# Altium schematic symbol library jlcpcb_2025_04_resistors_extended_2512.schlib: 2667 symbols (part 7 of 14)
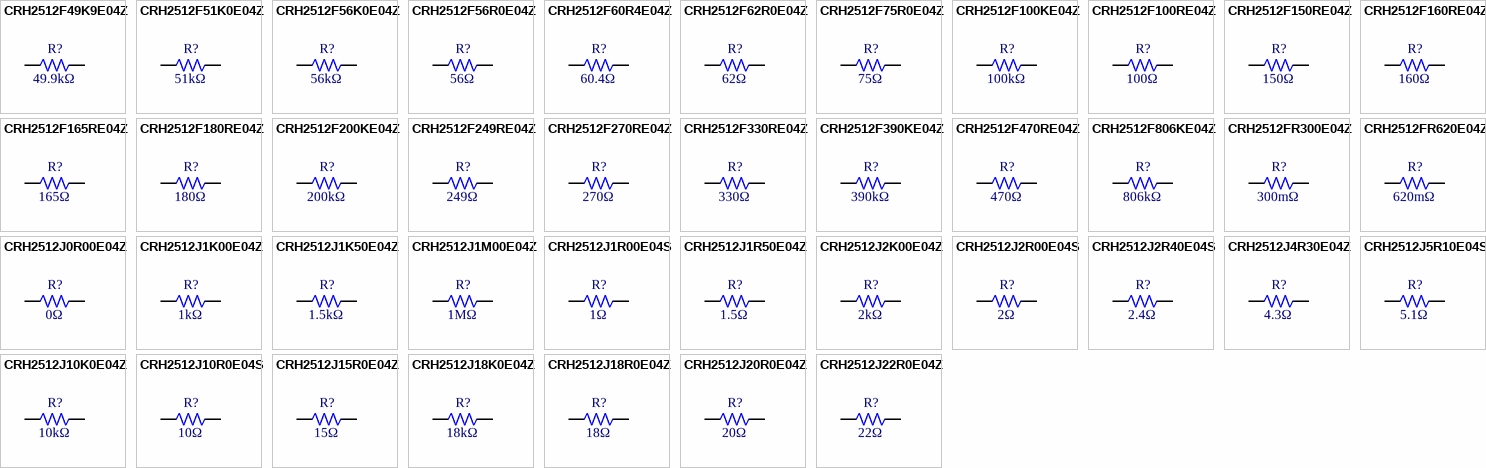
[diagram p72: symbols CRH2512F49K9E04Z to CRH2512J22R0E04Z]

## CRH2512J1K00E04Z
designator R?  Resistance: 1kΩ  (hidden comment: *)
Resistor, 1kΩ, ±5%, 2W, 200V, ±100ppm/℃, -55℃~+155℃, SMD 2512; Manufacturer: Uniroyal; Manufacturer Part Number: CRH2512J1K00E04Z; Supplier 1: LCSC; Supplier Part Number 1: C175457; JLCPCB Part Number: C175457; Power Rating: 2W; Category: Resistors; Package Size: 2512; JLCPCB Basic Part: Yes; Tolerance: ±5%; Voltage Rating: 200V; Temperature Coefficient: ±100ppm/℃; Temperature Rating: -55℃~+155℃; ComponentLink1Description: Datasheet; ComponentLink1URL: https://wmsc.lcsc.com/wmsc/upload/file/pdf/v2/lcsc/2304140030_Ever-Ohms-Tech-CRH2512J1K00E04Z_C175457.pdf; ComponentLink2Description: JLCPCB Part URL; ComponentLink2URL: https://jlcpcb.com/partdetail/C175457
pins: 1, 2
1 alternate drawing of the same symbol

## CRH2512J1K50E04Z
designator R?  Resistance: 1.5kΩ  (hidden comment: *)
Resistor, 1.5kΩ, ±5%, 2W, 200V, ±100ppm/℃, -55℃~+155℃, SMD 2512; Manufacturer: Uniroyal; Manufacturer Part Number: CRH2512J1K50E04Z; Supplier 1: LCSC; Supplier Part Number 1: C175461; JLCPCB Part Number: C175461; Power Rating: 2W; Category: Resistors; Package Size: 2512; JLCPCB Basic Part: Yes; Tolerance: ±5%; Voltage Rating: 200V; Temperature Coefficient: ±100ppm/℃; Temperature Rating: -55℃~+155℃; ComponentLink1Description: Datasheet; ComponentLink1URL: https://wmsc.lcsc.com/wmsc/upload/file/pdf/v2/lcsc/2304140030_Ever-Ohms-Tech-CRH2512J1K50E04Z_C175461.pdf; ComponentLink2Description: JLCPCB Part URL; ComponentLink2URL: https://jlcpcb.com/partdetail/C175461
pins: 1, 2
1 alternate drawing of the same symbol

## CRH2512J1M00E04Z
designator R?  Resistance: 1MΩ  (hidden comment: *)
Resistor, 1MΩ, ±5%, 2W, 200V, ±100ppm/℃, -55℃~+155℃, SMD 2512; Manufacturer: Uniroyal; Manufacturer Part Number: CRH2512J1M00E04Z; Supplier 1: LCSC; Supplier Part Number 1: C175493; JLCPCB Part Number: C175493; Power Rating: 2W; Category: Resistors; Package Size: 2512; JLCPCB Basic Part: Yes; Tolerance: ±5%; Voltage Rating: 200V; Temperature Coefficient: ±100ppm/℃; Temperature Rating: -55℃~+155℃; ComponentLink1Description: Datasheet; ComponentLink1URL: https://wmsc.lcsc.com/wmsc/upload/file/pdf/v2/lcsc/2304140030_Ever-Ohms-Tech-CRH2512J1M00E04Z_C175493.pdf; ComponentLink2Description: JLCPCB Part URL; ComponentLink2URL: https://jlcpcb.com/partdetail/C175493
pins: 1, 2
1 alternate drawing of the same symbol

## CRH2512J1R00E04S
designator R?  Resistance: 1Ω  (hidden comment: *)
Resistor, 1Ω, ±5%, 2W, 200V, ±400ppm/℃, -55℃~+155℃, SMD 2512; Manufacturer: Uniroyal; Manufacturer Part Number: CRH2512J1R00E04S; Supplier 1: LCSC; Supplier Part Number 1: C3002284; JLCPCB Part Number: C3002284; Power Rating: 2W; Category: Resistors; Package Size: 2512; JLCPCB Basic Part: Yes; Tolerance: ±5%; Voltage Rating: 200V; Temperature Coefficient: ±400ppm/℃; Temperature Rating: -55℃~+155℃; ComponentLink1Description: Datasheet; ComponentLink1URL: https://wmsc.lcsc.com/wmsc/upload/file/pdf/v2/lcsc/2204211700_Ever-Ohms-Tech-CRH2512J1R00E04S_C3002284.pdf; ComponentLink2Description: JLCPCB Part URL; ComponentLink2URL: https://jlcpcb.com/partdetail/C3002284
pins: 1, 2
1 alternate drawing of the same symbol

## CRH2512J1R50E04Z
designator R?  Resistance: 1.5Ω  (hidden comment: *)
Resistor, 1.5Ω, ±5%, 2W, 200V, ±400ppm/℃, -55℃~+155℃, SMD 2512; Manufacturer: Uniroyal; Manufacturer Part Number: CRH2512J1R50E04Z; Supplier 1: LCSC; Supplier Part Number 1: C175408; JLCPCB Part Number: C175408; Power Rating: 2W; Category: Resistors; Package Size: 2512; JLCPCB Basic Part: Yes; Tolerance: ±5%; Voltage Rating: 200V; Temperature Coefficient: ±400ppm/℃; Temperature Rating: -55℃~+155℃; ComponentLink1Description: Datasheet; ComponentLink1URL: https://wmsc.lcsc.com/wmsc/upload/file/pdf/v2/lcsc/2304140030_Ever-Ohms-Tech-CRH2512J1R50E04Z_C175408.pdf; ComponentLink2Description: JLCPCB Part URL; ComponentLink2URL: https://jlcpcb.com/partdetail/C175408
pins: 1, 2
1 alternate drawing of the same symbol

## CRH2512J2K00E04Z
designator R?  Resistance: 2kΩ  (hidden comment: *)
Resistor, 2kΩ, ±5%, 2W, 200V, ±100ppm/℃, -55℃~+155℃, SMD 2512; Manufacturer: Uniroyal; Manufacturer Part Number: CRH2512J2K00E04Z; Supplier 1: LCSC; Supplier Part Number 1: C175463; JLCPCB Part Number: C175463; Power Rating: 2W; Category: Resistors; Package Size: 2512; JLCPCB Basic Part: Yes; Tolerance: ±5%; Voltage Rating: 200V; Temperature Coefficient: ±100ppm/℃; Temperature Rating: -55℃~+155℃; ComponentLink1Description: Datasheet; ComponentLink1URL: https://wmsc.lcsc.com/wmsc/upload/file/pdf/v2/lcsc/2304140030_Ever-Ohms-Tech-CRH2512J2K00E04Z_C175463.pdf; ComponentLink2Description: JLCPCB Part URL; ComponentLink2URL: https://jlcpcb.com/partdetail/C175463
pins: 1, 2
1 alternate drawing of the same symbol

## CRH2512J2R00E04S
designator R?  Resistance: 2Ω  (hidden comment: *)
Resistor, 2Ω, ±5%, 2W, 200V, ±400ppm/℃, -55℃~+155℃, SMD 2512; Manufacturer: Uniroyal; Manufacturer Part Number: CRH2512J2R00E04S; Supplier 1: LCSC; Supplier Part Number 1: C2832125; JLCPCB Part Number: C2832125; Power Rating: 2W; Category: Resistors; Package Size: 2512; JLCPCB Basic Part: Yes; Tolerance: ±5%; Voltage Rating: 200V; Temperature Coefficient: ±400ppm/℃; Temperature Rating: -55℃~+155℃; ComponentLink1Description: Datasheet; ComponentLink1URL: https://wmsc.lcsc.com/wmsc/upload/file/pdf/v2/lcsc/2108241730_Ever-Ohms-Tech-CRH2512J2R00E04S_C2832125.pdf; ComponentLink2Description: JLCPCB Part URL; ComponentLink2URL: https://jlcpcb.com/partdetail/C2832125
pins: 1, 2
1 alternate drawing of the same symbol

## CRH2512J2R40E04S
designator R?  Resistance: 2.4Ω  (hidden comment: *)
Resistor, 2.4Ω, ±5%, 2W, 200V, ±400ppm/℃, -55℃~+155℃, SMD 2512; Manufacturer: Uniroyal; Manufacturer Part Number: CRH2512J2R40E04S; Supplier 1: LCSC; Supplier Part Number 1: C2972090; JLCPCB Part Number: C2972090; Power Rating: 2W; Category: Resistors; Package Size: 2512; JLCPCB Basic Part: Yes; Tolerance: ±5%; Voltage Rating: 200V; Temperature Coefficient: ±400ppm/℃; Temperature Rating: -55℃~+155℃; ComponentLink1Description: Datasheet; ComponentLink1URL: https://wmsc.lcsc.com/wmsc/upload/file/pdf/v2/lcsc/2201261400_Ever-Ohms-Tech-CRH2512J2R40E04S_C2972090.pdf; ComponentLink2Description: JLCPCB Part URL; ComponentLink2URL: https://jlcpcb.com/partdetail/C2972090
pins: 1, 2
1 alternate drawing of the same symbol

## CRH2512J4R30E04Z
designator R?  Resistance: 4.3Ω  (hidden comment: *)
Resistor, 4.3Ω, ±5%, 2W, 200V, ±400ppm/℃, -55℃~+155℃, SMD 2512; Manufacturer: Uniroyal; Manufacturer Part Number: CRH2512J4R30E04Z; Supplier 1: LCSC; Supplier Part Number 1: C175417; JLCPCB Part Number: C175417; Power Rating: 2W; Category: Resistors; Package Size: 2512; JLCPCB Basic Part: Yes; Tolerance: ±5%; Voltage Rating: 200V; Temperature Coefficient: ±400ppm/℃; Temperature Rating: -55℃~+155℃; ComponentLink1Description: Datasheet; ComponentLink1URL: https://wmsc.lcsc.com/wmsc/upload/file/pdf/v2/lcsc/2304140030_Ever-Ohms-Tech-CRH2512J4R30E04Z_C175417.pdf; ComponentLink2Description: JLCPCB Part URL; ComponentLink2URL: https://jlcpcb.com/partdetail/C175417
pins: 1, 2
1 alternate drawing of the same symbol

## CRH2512J5R10E04S
designator R?  Resistance: 5.1Ω  (hidden comment: *)
Resistor, 5.1Ω, ±5%, 2W, 200V, ±400ppm/℃, -55℃~+155℃, SMD 2512; Manufacturer: Uniroyal; Manufacturer Part Number: CRH2512J5R10E04S; Supplier 1: LCSC; Supplier Part Number 1: C3002283; JLCPCB Part Number: C3002283; Power Rating: 2W; Category: Resistors; Package Size: 2512; JLCPCB Basic Part: Yes; Tolerance: ±5%; Voltage Rating: 200V; Temperature Coefficient: ±400ppm/℃; Temperature Rating: -55℃~+155℃; ComponentLink1Description: Datasheet; ComponentLink1URL: https://wmsc.lcsc.com/wmsc/upload/file/pdf/v2/lcsc/2204211700_Ever-Ohms-Tech-CRH2512J5R10E04S_C3002283.pdf; ComponentLink2Description: JLCPCB Part URL; ComponentLink2URL: https://jlcpcb.com/partdetail/C3002283
pins: 1, 2
1 alternate drawing of the same symbol

## CRH2512J10K0E04Z
designator R?  Resistance: 10kΩ  (hidden comment: *)
Resistor, 10kΩ, ±5%, 2W, 200V, ±100ppm/℃, -55℃~+155℃, SMD 2512; Manufacturer: Uniroyal; Manufacturer Part Number: CRH2512J10K0E04Z; Supplier 1: LCSC; Supplier Part Number 1: C149859; JLCPCB Part Number: C149859; Power Rating: 2W; Category: Resistors; Package Size: 2512; JLCPCB Basic Part: Yes; Tolerance: ±5%; Voltage Rating: 200V; Temperature Coefficient: ±100ppm/℃; Temperature Rating: -55℃~+155℃; ComponentLink1Description: Datasheet; ComponentLink1URL: https://wmsc.lcsc.com/wmsc/upload/file/pdf/v2/lcsc/2304140030_Ever-Ohms-Tech-CRH2512J10K0E04Z_C149859.pdf; ComponentLink2Description: JLCPCB Part URL; ComponentLink2URL: https://jlcpcb.com/partdetail/C149859
pins: 1, 2
1 alternate drawing of the same symbol

## CRH2512J10R0E04S
designator R?  Resistance: 10Ω  (hidden comment: *)
Resistor, 10Ω, ±5%, 2W, 200V, ±100ppm/℃, -55℃~+155℃, SMD 2512; Manufacturer: Uniroyal; Manufacturer Part Number: CRH2512J10R0E04S; Supplier 1: LCSC; Supplier Part Number 1: C2909009; JLCPCB Part Number: C2909009; Power Rating: 2W; Category: Resistors; Package Size: 2512; JLCPCB Basic Part: Yes; Tolerance: ±5%; Voltage Rating: 200V; Temperature Coefficient: ±100ppm/℃; Temperature Rating: -55℃~+155℃; ComponentLink1Description: Datasheet; ComponentLink1URL: https://wmsc.lcsc.com/wmsc/upload/file/pdf/v2/lcsc/2110220930_Ever-Ohms-Tech-CRH2512J10R0E04S_C2909009.pdf; ComponentLink2Description: JLCPCB Part URL; ComponentLink2URL: https://jlcpcb.com/partdetail/C2909009
pins: 1, 2
1 alternate drawing of the same symbol

## CRH2512J15R0E04Z
designator R?  Resistance: 15Ω  (hidden comment: *)
Resistor, 15Ω, ±5%, 2W, 200V, ±100ppm/℃, -55℃~+155℃, SMD 2512; Manufacturer: Uniroyal; Manufacturer Part Number: CRH2512J15R0E04Z; Supplier 1: LCSC; Supplier Part Number 1: C175424; JLCPCB Part Number: C175424; Power Rating: 2W; Category: Resistors; Package Size: 2512; JLCPCB Basic Part: Yes; Tolerance: ±5%; Voltage Rating: 200V; Temperature Coefficient: ±100ppm/℃; Temperature Rating: -55℃~+155℃; ComponentLink1Description: Datasheet; ComponentLink1URL: https://wmsc.lcsc.com/wmsc/upload/file/pdf/v2/lcsc/2304140030_Ever-Ohms-Tech-CRH2512J15R0E04Z_C175424.pdf; ComponentLink2Description: JLCPCB Part URL; ComponentLink2URL: https://jlcpcb.com/partdetail/C175424
pins: 1, 2
1 alternate drawing of the same symbol

## CRH2512J18K0E04Z
designator R?  Resistance: 18kΩ  (hidden comment: *)
Resistor, 18kΩ, ±5%, 2W, 200V, ±100ppm/℃, -55℃~+155℃, SMD 2512; Manufacturer: Uniroyal; Manufacturer Part Number: CRH2512J18K0E04Z; Supplier 1: LCSC; Supplier Part Number 1: C175472; JLCPCB Part Number: C175472; Power Rating: 2W; Category: Resistors; Package Size: 2512; JLCPCB Basic Part: Yes; Tolerance: ±5%; Voltage Rating: 200V; Temperature Coefficient: ±100ppm/℃; Temperature Rating: -55℃~+155℃; ComponentLink1Description: Datasheet; ComponentLink1URL: https://wmsc.lcsc.com/wmsc/upload/file/pdf/v2/lcsc/2304140030_Ever-Ohms-Tech-CRH2512J18K0E04Z_C175472.pdf; ComponentLink2Description: JLCPCB Part URL; ComponentLink2URL: https://jlcpcb.com/partdetail/C175472
pins: 1, 2
1 alternate drawing of the same symbol

## CRH2512J18R0E04Z
designator R?  Resistance: 18Ω  (hidden comment: *)
Resistor, 18Ω, ±5%, 2W, 200V, ±100ppm/℃, -55℃~+155℃, SMD 2512; Manufacturer: Uniroyal; Manufacturer Part Number: CRH2512J18R0E04Z; Supplier 1: LCSC; Supplier Part Number 1: C175426; JLCPCB Part Number: C175426; Power Rating: 2W; Category: Resistors; Package Size: 2512; JLCPCB Basic Part: Yes; Tolerance: ±5%; Voltage Rating: 200V; Temperature Coefficient: ±100ppm/℃; Temperature Rating: -55℃~+155℃; ComponentLink1Description: Datasheet; ComponentLink1URL: https://wmsc.lcsc.com/wmsc/upload/file/pdf/v2/lcsc/2304140030_Ever-Ohms-Tech-CRH2512J18R0E04Z_C175426.pdf; ComponentLink2Description: JLCPCB Part URL; ComponentLink2URL: https://jlcpcb.com/partdetail/C175426
pins: 1, 2
1 alternate drawing of the same symbol

## CRH2512J20R0E04Z
designator R?  Resistance: 20Ω  (hidden comment: *)
Resistor, 20Ω, ±5%, 2W, 200V, ±100ppm/℃, -55℃~+155℃, SMD 2512; Manufacturer: Uniroyal; Manufacturer Part Number: CRH2512J20R0E04Z; Supplier 1: LCSC; Supplier Part Number 1: C175427; JLCPCB Part Number: C175427; Power Rating: 2W; Category: Resistors; Package Size: 2512; JLCPCB Basic Part: Yes; Tolerance: ±5%; Voltage Rating: 200V; Temperature Coefficient: ±100ppm/℃; Temperature Rating: -55℃~+155℃; ComponentLink1Description: Datasheet; ComponentLink1URL: https://wmsc.lcsc.com/wmsc/upload/file/pdf/v2/lcsc/2304140030_Ever-Ohms-Tech-CRH2512J20R0E04Z_C175427.pdf; ComponentLink2Description: JLCPCB Part URL; ComponentLink2URL: https://jlcpcb.com/partdetail/C175427
pins: 1, 2
1 alternate drawing of the same symbol

## CRH2512J22R0E04Z
designator R?  Resistance: 22Ω  (hidden comment: *)
Resistor, 22Ω, ±5%, 2W, 200V, ±100ppm/℃, -55℃~+155℃, SMD 2512; Manufacturer: Uniroyal; Manufacturer Part Number: CRH2512J22R0E04Z; Supplier 1: LCSC; Supplier Part Number 1: C175428; JLCPCB Part Number: C175428; Power Rating: 2W; Category: Resistors; Package Size: 2512; JLCPCB Basic Part: Yes; Tolerance: ±5%; Voltage Rating: 200V; Temperature Coefficient: ±100ppm/℃; Temperature Rating: -55℃~+155℃; ComponentLink1Description: Datasheet; ComponentLink1URL: https://wmsc.lcsc.com/wmsc/upload/file/pdf/v2/lcsc/2304140030_Ever-Ohms-Tech-CRH2512J22R0E04Z_C175428.pdf; ComponentLink2Description: JLCPCB Part URL; ComponentLink2URL: https://jlcpcb.com/partdetail/C175428
pins: 1, 2
1 alternate drawing of the same symbol

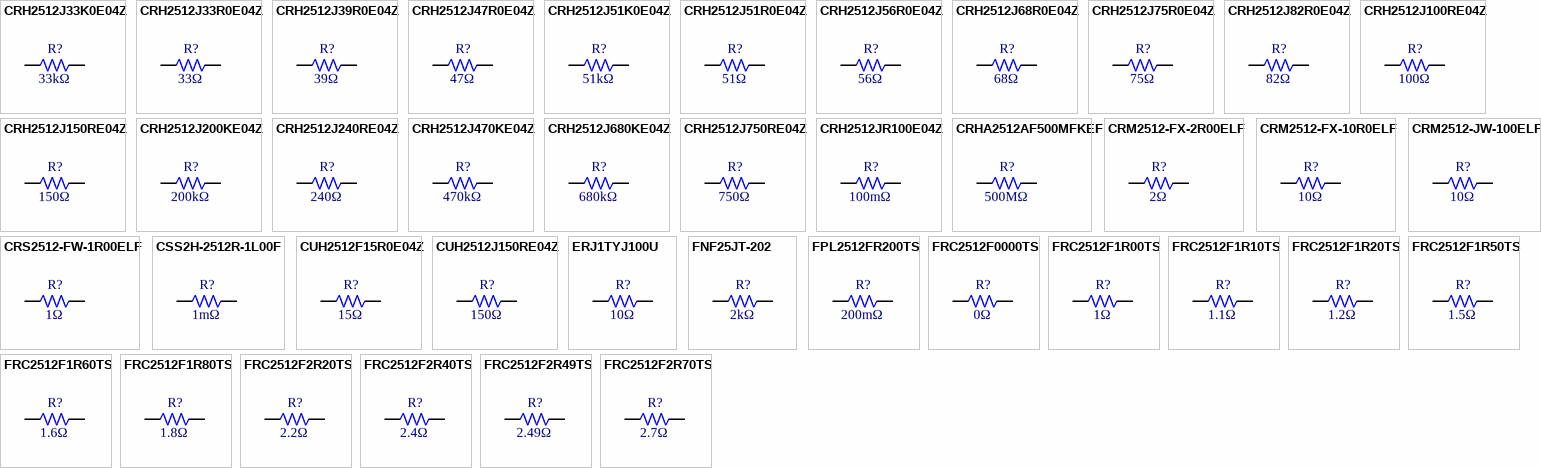
[diagram p30: symbols CRH2512J33K0E04Z to FRC2512F2R70TS]

## CRH2512J33K0E04Z
designator R?  Resistance: 33kΩ  (hidden comment: *)
Resistor, 33kΩ, ±5%, 2W, 200V, ±100ppm/℃, -55℃~+155℃, SMD 2512; Manufacturer: Uniroyal; Manufacturer Part Number: CRH2512J33K0E04Z; Supplier 1: LCSC; Supplier Part Number 1: C175474; JLCPCB Part Number: C175474; Power Rating: 2W; Category: Resistors; Package Size: 2512; JLCPCB Basic Part: Yes; Tolerance: ±5%; Voltage Rating: 200V; Temperature Coefficient: ±100ppm/℃; Temperature Rating: -55℃~+155℃; ComponentLink1Description: Datasheet; ComponentLink1URL: https://wmsc.lcsc.com/wmsc/upload/file/pdf/v2/lcsc/2304140030_Ever-Ohms-Tech-CRH2512J33K0E04Z_C175474.pdf; ComponentLink2Description: JLCPCB Part URL; ComponentLink2URL: https://jlcpcb.com/partdetail/C175474
pins: 1, 2
1 alternate drawing of the same symbol

## CRH2512J33R0E04Z
designator R?  Resistance: 33Ω  (hidden comment: *)
Resistor, 33Ω, ±5%, 2W, 200V, ±200ppm/℃, -55℃~+155℃, SMD 2512; Manufacturer: Uniroyal; Manufacturer Part Number: CRH2512J33R0E04Z; Supplier 1: LCSC; Supplier Part Number 1: C2835761; JLCPCB Part Number: C2835761; Power Rating: 2W; Category: Resistors; Package Size: 2512; JLCPCB Basic Part: Yes; Tolerance: ±5%; Voltage Rating: 200V; Temperature Coefficient: ±200ppm/℃; Temperature Rating: -55℃~+155℃; ComponentLink1Description: Datasheet; ComponentLink1URL: https://wmsc.lcsc.com/wmsc/upload/file/pdf/v2/lcsc/2105251933_Ever-Ohms-Tech-CRH2512J33R0E04Z_C2835761.pdf; ComponentLink2Description: JLCPCB Part URL; ComponentLink2URL: https://jlcpcb.com/partdetail/C2835761
pins: 1, 2
1 alternate drawing of the same symbol

## CRH2512J39R0E04Z
designator R?  Resistance: 39Ω  (hidden comment: *)
Resistor, 39Ω, ±5%, 2W, 200V, ±100ppm/℃, -55℃~+155℃, SMD 2512; Manufacturer: Uniroyal; Manufacturer Part Number: CRH2512J39R0E04Z; Supplier 1: LCSC; Supplier Part Number 1: C175429; JLCPCB Part Number: C175429; Power Rating: 2W; Category: Resistors; Package Size: 2512; JLCPCB Basic Part: Yes; Tolerance: ±5%; Voltage Rating: 200V; Temperature Coefficient: ±100ppm/℃; Temperature Rating: -55℃~+155℃; ComponentLink1Description: Datasheet; ComponentLink1URL: https://wmsc.lcsc.com/wmsc/upload/file/pdf/v2/lcsc/2304140030_Ever-Ohms-Tech-CRH2512J39R0E04Z_C175429.pdf; ComponentLink2Description: JLCPCB Part URL; ComponentLink2URL: https://jlcpcb.com/partdetail/C175429
pins: 1, 2
1 alternate drawing of the same symbol

## CRH2512J47R0E04Z
designator R?  Resistance: 47Ω  (hidden comment: *)
Resistor, 47Ω, ±5%, 2W, 200V, ±100ppm/℃, -55℃~+155℃, SMD 2512; Manufacturer: Uniroyal; Manufacturer Part Number: CRH2512J47R0E04Z; Supplier 1: LCSC; Supplier Part Number 1: C175430; JLCPCB Part Number: C175430; Power Rating: 2W; Category: Resistors; Package Size: 2512; JLCPCB Basic Part: Yes; Tolerance: ±5%; Voltage Rating: 200V; Temperature Coefficient: ±100ppm/℃; Temperature Rating: -55℃~+155℃; ComponentLink1Description: Datasheet; ComponentLink1URL: https://wmsc.lcsc.com/wmsc/upload/file/pdf/v2/lcsc/2304140030_Ever-Ohms-Tech-CRH2512J47R0E04Z_C175430.pdf; ComponentLink2Description: JLCPCB Part URL; ComponentLink2URL: https://jlcpcb.com/partdetail/C175430
pins: 1, 2
1 alternate drawing of the same symbol

## CRH2512J51K0E04Z
designator R?  Resistance: 51kΩ  (hidden comment: *)
Resistor, 51kΩ, ±5%, 2W, 200V, ±100ppm/℃, -55℃~+155℃, SMD 2512; Manufacturer: Uniroyal; Manufacturer Part Number: CRH2512J51K0E04Z; Supplier 1: LCSC; Supplier Part Number 1: C175479; JLCPCB Part Number: C175479; Power Rating: 2W; Category: Resistors; Package Size: 2512; JLCPCB Basic Part: Yes; Tolerance: ±5%; Voltage Rating: 200V; Temperature Coefficient: ±100ppm/℃; Temperature Rating: -55℃~+155℃; ComponentLink1Description: Datasheet; ComponentLink1URL: https://wmsc.lcsc.com/wmsc/upload/file/pdf/v2/lcsc/2304140030_Ever-Ohms-Tech-CRH2512J51K0E04Z_C175479.pdf; ComponentLink2Description: JLCPCB Part URL; ComponentLink2URL: https://jlcpcb.com/partdetail/C175479
pins: 1, 2
1 alternate drawing of the same symbol

## CRH2512J51R0E04Z
designator R?  Resistance: 51Ω  (hidden comment: *)
Resistor, 51Ω, ±5%, 2W, 200V, ±200ppm/℃, -55℃~+155℃, SMD 2512; Manufacturer: Uniroyal; Manufacturer Part Number: CRH2512J51R0E04Z; Supplier 1: LCSC; Supplier Part Number 1: C175432; JLCPCB Part Number: C175432; Power Rating: 2W; Category: Resistors; Package Size: 2512; JLCPCB Basic Part: Yes; Tolerance: ±5%; Voltage Rating: 200V; Temperature Coefficient: ±200ppm/℃; Temperature Rating: -55℃~+155℃; ComponentLink1Description: Datasheet; ComponentLink1URL: https://wmsc.lcsc.com/wmsc/upload/file/pdf/v2/lcsc/2304140030_Ever-Ohms-Tech-CRH2512J51R0E04Z_C175432.pdf; ComponentLink2Description: JLCPCB Part URL; ComponentLink2URL: https://jlcpcb.com/partdetail/C175432
pins: 1, 2
1 alternate drawing of the same symbol

## CRH2512J56R0E04Z
designator R?  Resistance: 56Ω  (hidden comment: *)
Resistor, 56Ω, ±5%, 2W, 200V, ±100ppm/℃, -55℃~+155℃, SMD 2512; Manufacturer: Uniroyal; Manufacturer Part Number: CRH2512J56R0E04Z; Supplier 1: LCSC; Supplier Part Number 1: C175433; JLCPCB Part Number: C175433; Power Rating: 2W; Category: Resistors; Package Size: 2512; JLCPCB Basic Part: Yes; Tolerance: ±5%; Voltage Rating: 200V; Temperature Coefficient: ±100ppm/℃; Temperature Rating: -55℃~+155℃; ComponentLink1Description: Datasheet; ComponentLink1URL: https://wmsc.lcsc.com/wmsc/upload/file/pdf/v2/lcsc/2304140030_Ever-Ohms-Tech-CRH2512J56R0E04Z_C175433.pdf; ComponentLink2Description: JLCPCB Part URL; ComponentLink2URL: https://jlcpcb.com/partdetail/C175433
pins: 1, 2
1 alternate drawing of the same symbol

## CRH2512J68R0E04Z
designator R?  Resistance: 68Ω  (hidden comment: *)
Resistor, 68Ω, ±5%, 2W, 200V, ±100ppm/℃, -55℃~+155℃, SMD 2512; Manufacturer: Uniroyal; Manufacturer Part Number: CRH2512J68R0E04Z; Supplier 1: LCSC; Supplier Part Number 1: C175435; JLCPCB Part Number: C175435; Power Rating: 2W; Category: Resistors; Package Size: 2512; JLCPCB Basic Part: Yes; Tolerance: ±5%; Voltage Rating: 200V; Temperature Coefficient: ±100ppm/℃; Temperature Rating: -55℃~+155℃; ComponentLink1Description: Datasheet; ComponentLink1URL: https://wmsc.lcsc.com/wmsc/upload/file/pdf/v2/lcsc/2304140030_Ever-Ohms-Tech-CRH2512J68R0E04Z_C175435.pdf; ComponentLink2Description: JLCPCB Part URL; ComponentLink2URL: https://jlcpcb.com/partdetail/C175435
pins: 1, 2
1 alternate drawing of the same symbol

## CRH2512J75R0E04Z
designator R?  Resistance: 75Ω  (hidden comment: *)
Resistor, 75Ω, ±5%, 2W, 200V, ±100ppm/℃, -55℃~+155℃, SMD 2512; Manufacturer: Uniroyal; Manufacturer Part Number: CRH2512J75R0E04Z; Supplier 1: LCSC; Supplier Part Number 1: C175437; JLCPCB Part Number: C175437; Power Rating: 2W; Category: Resistors; Package Size: 2512; JLCPCB Basic Part: Yes; Tolerance: ±5%; Voltage Rating: 200V; Temperature Coefficient: ±100ppm/℃; Temperature Rating: -55℃~+155℃; ComponentLink1Description: Datasheet; ComponentLink1URL: https://wmsc.lcsc.com/wmsc/upload/file/pdf/v2/lcsc/2304140030_Ever-Ohms-Tech-CRH2512J75R0E04Z_C175437.pdf; ComponentLink2Description: JLCPCB Part URL; ComponentLink2URL: https://jlcpcb.com/partdetail/C175437
pins: 1, 2
1 alternate drawing of the same symbol

## CRH2512J82R0E04Z
designator R?  Resistance: 82Ω  (hidden comment: *)
Resistor, 82Ω, ±5%, 2W, 200V, ±100ppm/℃, -55℃~+155℃, SMD 2512; Manufacturer: Uniroyal; Manufacturer Part Number: CRH2512J82R0E04Z; Supplier 1: LCSC; Supplier Part Number 1: C175438; JLCPCB Part Number: C175438; Power Rating: 2W; Category: Resistors; Package Size: 2512; JLCPCB Basic Part: Yes; Tolerance: ±5%; Voltage Rating: 200V; Temperature Coefficient: ±100ppm/℃; Temperature Rating: -55℃~+155℃; ComponentLink1Description: Datasheet; ComponentLink1URL: https://wmsc.lcsc.com/wmsc/upload/file/pdf/v2/lcsc/2304140030_Ever-Ohms-Tech-CRH2512J82R0E04Z_C175438.pdf; ComponentLink2Description: JLCPCB Part URL; ComponentLink2URL: https://jlcpcb.com/partdetail/C175438
pins: 1, 2
1 alternate drawing of the same symbol

## CRH2512J100RE04Z
designator R?  Resistance: 100Ω  (hidden comment: *)
Resistor, 100Ω, ±5%, 2W, 200V, ±100ppm/℃, -55℃~+155℃, SMD 2512; Manufacturer: Uniroyal; Manufacturer Part Number: CRH2512J100RE04Z; Supplier 1: LCSC; Supplier Part Number 1: C175441; JLCPCB Part Number: C175441; Power Rating: 2W; Category: Resistors; Package Size: 2512; JLCPCB Basic Part: Yes; Tolerance: ±5%; Voltage Rating: 200V; Temperature Coefficient: ±100ppm/℃; Temperature Rating: -55℃~+155℃; ComponentLink1Description: Datasheet; ComponentLink1URL: https://wmsc.lcsc.com/wmsc/upload/file/pdf/v2/lcsc/2304140030_Ever-Ohms-Tech-CRH2512J100RE04Z_C175441.pdf; ComponentLink2Description: JLCPCB Part URL; ComponentLink2URL: https://jlcpcb.com/partdetail/C175441
pins: 1, 2
1 alternate drawing of the same symbol

## CRH2512J150RE04Z
designator R?  Resistance: 150Ω  (hidden comment: *)
Resistor, 150Ω, ±5%, 2W, 200V, ±100ppm/℃, -55℃~+155℃, SMD 2512; Manufacturer: Uniroyal; Manufacturer Part Number: CRH2512J150RE04Z; Supplier 1: LCSC; Supplier Part Number 1: C175446; JLCPCB Part Number: C175446; Power Rating: 2W; Category: Resistors; Package Size: 2512; JLCPCB Basic Part: Yes; Tolerance: ±5%; Voltage Rating: 200V; Temperature Coefficient: ±100ppm/℃; Temperature Rating: -55℃~+155℃; ComponentLink1Description: Datasheet; ComponentLink1URL: https://wmsc.lcsc.com/wmsc/upload/file/pdf/v2/lcsc/2304140030_Ever-Ohms-Tech-CRH2512J150RE04Z_C175446.pdf; ComponentLink2Description: JLCPCB Part URL; ComponentLink2URL: https://jlcpcb.com/partdetail/C175446
pins: 1, 2
1 alternate drawing of the same symbol

## CRH2512J200KE04Z
designator R?  Resistance: 200kΩ  (hidden comment: *)
Resistor, 200kΩ, ±5%, 2W, 200V, ±100ppm/℃, -55℃~+155℃, SMD 2512; Manufacturer: Uniroyal; Manufacturer Part Number: CRH2512J200KE04Z; Supplier 1: LCSC; Supplier Part Number 1: C175486; JLCPCB Part Number: C175486; Power Rating: 2W; Category: Resistors; Package Size: 2512; JLCPCB Basic Part: Yes; Tolerance: ±5%; Voltage Rating: 200V; Temperature Coefficient: ±100ppm/℃; Temperature Rating: -55℃~+155℃; ComponentLink1Description: Datasheet; ComponentLink1URL: https://wmsc.lcsc.com/wmsc/upload/file/pdf/v2/lcsc/2304140030_Ever-Ohms-Tech-CRH2512J200KE04Z_C175486.pdf; ComponentLink2Description: JLCPCB Part URL; ComponentLink2URL: https://jlcpcb.com/partdetail/C175486
pins: 1, 2
1 alternate drawing of the same symbol

## CRH2512J240RE04Z
designator R?  Resistance: 240Ω  (hidden comment: *)
Resistor, 240Ω, ±5%, 2W, 200V, ±100ppm/℃, -55℃~+155℃, SMD 2512; Manufacturer: Uniroyal; Manufacturer Part Number: CRH2512J240RE04Z; Supplier 1: LCSC; Supplier Part Number 1: C175449; JLCPCB Part Number: C175449; Power Rating: 2W; Category: Resistors; Package Size: 2512; JLCPCB Basic Part: Yes; Tolerance: ±5%; Voltage Rating: 200V; Temperature Coefficient: ±100ppm/℃; Temperature Rating: -55℃~+155℃; ComponentLink1Description: Datasheet; ComponentLink1URL: https://wmsc.lcsc.com/wmsc/upload/file/pdf/v2/lcsc/2304140030_Ever-Ohms-Tech-CRH2512J240RE04Z_C175449.pdf; ComponentLink2Description: JLCPCB Part URL; ComponentLink2URL: https://jlcpcb.com/partdetail/C175449
pins: 1, 2
1 alternate drawing of the same symbol

## CRH2512J470KE04Z
designator R?  Resistance: 470kΩ  (hidden comment: *)
Resistor, 470kΩ, ±5%, 2W, 200V, ±100ppm/℃, -55℃~+155℃, SMD 2512; Manufacturer: Uniroyal; Manufacturer Part Number: CRH2512J470KE04Z; Supplier 1: LCSC; Supplier Part Number 1: C175490; JLCPCB Part Number: C175490; Power Rating: 2W; Category: Resistors; Package Size: 2512; JLCPCB Basic Part: Yes; Tolerance: ±5%; Voltage Rating: 200V; Temperature Coefficient: ±100ppm/℃; Temperature Rating: -55℃~+155℃; ComponentLink1Description: Datasheet; ComponentLink1URL: https://wmsc.lcsc.com/wmsc/upload/file/pdf/v2/lcsc/2304140030_Ever-Ohms-Tech-CRH2512J470KE04Z_C175490.pdf; ComponentLink2Description: JLCPCB Part URL; ComponentLink2URL: https://jlcpcb.com/partdetail/C175490
pins: 1, 2
1 alternate drawing of the same symbol

## CRH2512J680KE04Z
designator R?  Resistance: 680kΩ  (hidden comment: *)
Resistor, 680kΩ, ±5%, 2W, 200V, ±100ppm/℃, -55℃~+155℃, SMD 2512; Manufacturer: Uniroyal; Manufacturer Part Number: CRH2512J680KE04Z; Supplier 1: LCSC; Supplier Part Number 1: C175492; JLCPCB Part Number: C175492; Power Rating: 2W; Category: Resistors; Package Size: 2512; JLCPCB Basic Part: Yes; Tolerance: ±5%; Voltage Rating: 200V; Temperature Coefficient: ±100ppm/℃; Temperature Rating: -55℃~+155℃; ComponentLink1Description: Datasheet; ComponentLink1URL: https://wmsc.lcsc.com/wmsc/upload/file/pdf/v2/lcsc/2304140030_Ever-Ohms-Tech-CRH2512J680KE04Z_C175492.pdf; ComponentLink2Description: JLCPCB Part URL; ComponentLink2URL: https://jlcpcb.com/partdetail/C175492
pins: 1, 2
1 alternate drawing of the same symbol

## CRH2512J750RE04Z
designator R?  Resistance: 750Ω  (hidden comment: *)
Resistor, 750Ω, ±5%, 2W, 200V, ±100ppm/℃, -55℃~+155℃, SMD 2512; Manufacturer: Uniroyal; Manufacturer Part Number: CRH2512J750RE04Z; Supplier 1: LCSC; Supplier Part Number 1: C175455; JLCPCB Part Number: C175455; Power Rating: 2W; Category: Resistors; Package Size: 2512; JLCPCB Basic Part: Yes; Tolerance: ±5%; Voltage Rating: 200V; Temperature Coefficient: ±100ppm/℃; Temperature Rating: -55℃~+155℃; ComponentLink1Description: Datasheet; ComponentLink1URL: https://wmsc.lcsc.com/wmsc/upload/file/pdf/v2/lcsc/2304140030_Ever-Ohms-Tech-CRH2512J750RE04Z_C175455.pdf; ComponentLink2Description: JLCPCB Part URL; ComponentLink2URL: https://jlcpcb.com/partdetail/C175455
pins: 1, 2
1 alternate drawing of the same symbol

## CRH2512JR100E04Z
designator R?  Resistance: 100mΩ  (hidden comment: *)
Resistor, 100mΩ, ±5%, 2W, 200V, -55℃~+155℃, SMD 2512; Manufacturer: Uniroyal; Manufacturer Part Number: CRH2512JR100E04Z; Supplier 1: LCSC; Supplier Part Number 1: C149858; JLCPCB Part Number: C149858; Power Rating: 2W; Category: Resistors; Package Size: 2512; JLCPCB Basic Part: Yes; Tolerance: ±5%; Voltage Rating: 200V; Temperature Rating: -55℃~+155℃; ComponentLink1Description: Datasheet; ComponentLink1URL: https://wmsc.lcsc.com/wmsc/upload/file/pdf/v2/lcsc/2304140030_Ever-Ohms-Tech-CRH2512JR100E04Z_C149858.pdf; ComponentLink2Description: JLCPCB Part URL; ComponentLink2URL: https://jlcpcb.com/partdetail/C149858
pins: 1, 2
1 alternate drawing of the same symbol

## CRHA2512AF500MFKEF
designator R?  Resistance: 500MΩ  (hidden comment: *)
Resistor, 500MΩ, ±1%, 1W, ±100ppm/℃, -55℃~+155℃, SMD 2512; Manufacturer: Uniroyal; Manufacturer Part Number: CRHA2512AF500MFKEF; Supplier 1: LCSC; Supplier Part Number 1: C4045797; JLCPCB Part Number: C4045797; Power Rating: 1W; Category: Resistors; Package Size: 2512; JLCPCB Basic Part: Yes; Tolerance: ±1%; Temperature Coefficient: ±100ppm/℃; Temperature Rating: -55℃~+155℃; ComponentLink1Description: Datasheet; ComponentLink1URL: https://wmsc.lcsc.com/wmsc/upload/file/pdf/v2/lcsc/2312130937_Vishay-Intertech-CRHA2512AF500MFKEF_C4045797.pdf; ComponentLink2Description: JLCPCB Part URL; ComponentLink2URL: https://jlcpcb.com/partdetail/C4045797
pins: 1, 2
1 alternate drawing of the same symbol

## CRM2512-FX-2R00ELF
designator R?  Resistance: 2Ω  (hidden comment: *)
Resistor, 2Ω, ±1%, 2W, ±100ppm/℃, -55℃~+155℃, SMD 2512; Manufacturer: Uniroyal; Manufacturer Part Number: CRM2512-FX-2R00ELF; Supplier 1: LCSC; Supplier Part Number 1: C3013496; JLCPCB Part Number: C3013496; Power Rating: 2W; Category: Resistors; Package Size: 2512; JLCPCB Basic Part: Yes; Tolerance: ±1%; Temperature Coefficient: ±100ppm/℃; Temperature Rating: -55℃~+155℃; ComponentLink1Description: Datasheet; ComponentLink1URL: https://wmsc.lcsc.com/wmsc/upload/file/pdf/v2/lcsc/2206201745_BOURNS-CRM2512-FX-2R00ELF_C3013496.pdf; ComponentLink2Description: JLCPCB Part URL; ComponentLink2URL: https://jlcpcb.com/partdetail/C3013496
pins: 1, 2
1 alternate drawing of the same symbol

## CRM2512-FX-10R0ELF
designator R?  Resistance: 10Ω  (hidden comment: *)
Resistor, 10Ω, ±1%, 2W, ±100ppm/℃, -55℃~+155℃, SMD 2512; Manufacturer: Uniroyal; Manufacturer Part Number: CRM2512-FX-10R0ELF; Supplier 1: LCSC; Supplier Part Number 1: C840605; JLCPCB Part Number: C840605; Power Rating: 2W; Category: Resistors; Package Size: 2512; JLCPCB Basic Part: Yes; Tolerance: ±1%; Temperature Coefficient: ±100ppm/℃; Temperature Rating: -55℃~+155℃; ComponentLink1Description: Datasheet; ComponentLink1URL: https://wmsc.lcsc.com/wmsc/upload/file/pdf/v2/lcsc/2304140030_BOURNS-CRM2512-FX-10R0ELF_C840605.pdf; ComponentLink2Description: JLCPCB Part URL; ComponentLink2URL: https://jlcpcb.com/partdetail/C840605
pins: 1, 2
1 alternate drawing of the same symbol

## CRM2512-JW-100ELF
designator R?  Resistance: 10Ω  (hidden comment: *)
Resistor, 10Ω, ±5%, 2W, ±200ppm/℃, -55℃~+155℃, SMD 2512; Manufacturer: Uniroyal; Manufacturer Part Number: CRM2512-JW-100ELF; Supplier 1: LCSC; Supplier Part Number 1: C840601; JLCPCB Part Number: C840601; Power Rating: 2W; Category: Resistors; Package Size: 2512; JLCPCB Basic Part: Yes; Tolerance: ±5%; Temperature Coefficient: ±200ppm/℃; Temperature Rating: -55℃~+155℃; ComponentLink1Description: Datasheet; ComponentLink1URL: https://wmsc.lcsc.com/wmsc/upload/file/pdf/v2/lcsc/2206201715_BOURNS-CRM2512-JW-100ELF_C840601.pdf; ComponentLink2Description: JLCPCB Part URL; ComponentLink2URL: https://jlcpcb.com/partdetail/C840601
pins: 1, 2
1 alternate drawing of the same symbol

## CRS2512-FW-1R00ELF
designator R?  Resistance: 1Ω  (hidden comment: *)
Resistor, 1Ω, ±1%, 2W, ±200ppm/℃, -55℃~+155℃, SMD 2512; Manufacturer: Uniroyal; Manufacturer Part Number: CRS2512-FW-1R00ELF; Supplier 1: LCSC; Supplier Part Number 1: C350875; JLCPCB Part Number: C350875; Power Rating: 2W; Category: Resistors; Package Size: 2512; JLCPCB Basic Part: Yes; Tolerance: ±1%; Temperature Coefficient: ±200ppm/℃; Temperature Rating: -55℃~+155℃; ComponentLink1Description: Datasheet; ComponentLink1URL: https://wmsc.lcsc.com/wmsc/upload/file/pdf/v2/lcsc/1912111437_BOURNS-CRS2512-FW-1R00ELF_C350875.pdf; ComponentLink2Description: JLCPCB Part URL; ComponentLink2URL: https://jlcpcb.com/partdetail/C350875
pins: 1, 2
1 alternate drawing of the same symbol

## CSS2H-2512R-1L00F
designator R?  Resistance: 1mΩ  (hidden comment: *)
Resistor, 1mΩ, ±1%, 5W, ±50ppm/℃, -55℃~+170℃, SMD 2512; Manufacturer: Uniroyal; Manufacturer Part Number: CSS2H-2512R-1L00F; Supplier 1: LCSC; Supplier Part Number 1: C4175647; JLCPCB Part Number: C4175647; Power Rating: 5W; Category: Resistors; Package Size: 2512; JLCPCB Basic Part: Yes; Tolerance: ±1%; Temperature Coefficient: ±50ppm/℃; Temperature Rating: -55℃~+170℃; ComponentLink1Description: Datasheet; ComponentLink1URL: https://wmsc.lcsc.com/wmsc/upload/file/pdf/v2/lcsc/2401221722_BOURNS-CSS2H-2512R-1L00F_C4175647.pdf; ComponentLink2Description: JLCPCB Part URL; ComponentLink2URL: https://jlcpcb.com/partdetail/C4175647
pins: 1, 2
1 alternate drawing of the same symbol

## CUH2512F15R0E04Z
designator R?  Resistance: 15Ω  (hidden comment: *)
Resistor, 15Ω, ±1%, 3W, 250V, ±150ppm/℃, -55℃~+155℃, SMD 2512; Manufacturer: Uniroyal; Manufacturer Part Number: CUH2512F15R0E04Z; Supplier 1: LCSC; Supplier Part Number 1: C2992637; JLCPCB Part Number: C2992637; Power Rating: 3W; Category: Resistors; Package Size: 2512; JLCPCB Basic Part: Yes; Tolerance: ±1%; Voltage Rating: 250V; Temperature Coefficient: ±150ppm/℃; Temperature Rating: -55℃~+155℃; ComponentLink1Description: Datasheet; ComponentLink1URL: https://wmsc.lcsc.com/wmsc/upload/file/pdf/v2/lcsc/2204081930_Ever-Ohms-Tech-CUH2512F15R0E04Z_C2992637.pdf; ComponentLink2Description: JLCPCB Part URL; ComponentLink2URL: https://jlcpcb.com/partdetail/C2992637
pins: 1, 2
1 alternate drawing of the same symbol

## CUH2512J150RE04Z
designator R?  Resistance: 150Ω  (hidden comment: *)
Resistor, 150Ω, ±5%, 3W, 250V, ±150ppm/℃, -55℃~+155℃, SMD 2512; Manufacturer: Uniroyal; Manufacturer Part Number: CUH2512J150RE04Z; Supplier 1: LCSC; Supplier Part Number 1: C2992638; JLCPCB Part Number: C2992638; Power Rating: 3W; Category: Resistors; Package Size: 2512; JLCPCB Basic Part: Yes; Tolerance: ±5%; Voltage Rating: 250V; Temperature Coefficient: ±150ppm/℃; Temperature Rating: -55℃~+155℃; ComponentLink1Description: Datasheet; ComponentLink1URL: https://wmsc.lcsc.com/wmsc/upload/file/pdf/v2/lcsc/2204081930_Ever-Ohms-Tech-CUH2512J150RE04Z_C2992638.pdf; ComponentLink2Description: JLCPCB Part URL; ComponentLink2URL: https://jlcpcb.com/partdetail/C2992638
pins: 1, 2
1 alternate drawing of the same symbol

## ERJ1TYJ100U
designator R?  Resistance: 10Ω  (hidden comment: *)
Resistor, 10Ω, ±5%, 1W, ±200ppm/℃, -55℃~+155℃, SMD 2512; Manufacturer: Uniroyal; Manufacturer Part Number: ERJ1TYJ100U; Supplier 1: LCSC; Supplier Part Number 1: C95674; JLCPCB Part Number: C95674; Power Rating: 1W; Category: Resistors; Package Size: 2512; JLCPCB Basic Part: Yes; Tolerance: ±5%; Temperature Coefficient: ±200ppm/℃; Temperature Rating: -55℃~+155℃; ComponentLink1Description: Datasheet; ComponentLink1URL: https://wmsc.lcsc.com/wmsc/upload/file/pdf/v2/lcsc/1912111437_PANASONIC-ERJ1TYJ100U_C95674.pdf; ComponentLink2Description: JLCPCB Part URL; ComponentLink2URL: https://jlcpcb.com/partdetail/C95674
pins: 1, 2
1 alternate drawing of the same symbol

## FNF25JT-202
designator R?  Resistance: 2kΩ  (hidden comment: *)
Resistor, 2kΩ, ±5%, 1W, SMD 2512; Manufacturer: Uniroyal; Manufacturer Part Number: FNF25JT-202; Supplier 1: LCSC; Supplier Part Number 1: C335232; JLCPCB Part Number: C335232; Power Rating: 1W; Category: Resistors; Package Size: 2512; JLCPCB Basic Part: Yes; Tolerance: ±5%; ComponentLink1Description: Datasheet; ComponentLink1URL: https://wmsc.lcsc.com/wmsc/upload/file/pdf/v2/lcsc/2304140030_PSA-Prosperity-Dielectrics-FNF25JT-202_C335232.pdf; ComponentLink2Description: JLCPCB Part URL; ComponentLink2URL: https://jlcpcb.com/partdetail/C335232
pins: 1, 2
1 alternate drawing of the same symbol

## FPL2512FR200TS
designator R?  Resistance: 200mΩ  (hidden comment: *)
Resistor, 200mΩ, ±1%, 2W, SMD 2512; Manufacturer: Uniroyal; Manufacturer Part Number: FPL2512FR200TS; Supplier 1: LCSC; Supplier Part Number 1: C18164315; JLCPCB Part Number: C18164315; Power Rating: 2W; Category: Resistors; Package Size: 2512; JLCPCB Basic Part: Yes; Tolerance: ±1%; ComponentLink1Description: Datasheet; ComponentLink1URL: https://wmsc.lcsc.com/wmsc/upload/file/pdf/v2/lcsc/2309150924_FOJAN-FPL2512FR200TS_C18164315.pdf; ComponentLink2Description: JLCPCB Part URL; ComponentLink2URL: https://jlcpcb.com/partdetail/C18164315
pins: 1, 2
1 alternate drawing of the same symbol
